# Altium footprint library LukaLIBRARY.PcbLib: 784 footprints (part 33 of 49)
Each footprint in its own frame and in the unit in brackets; x right, y up, seen from the top. Pads: shape width x height; smd on the part's side, far side on the other; paste and mask are expansions set on the pad; w line width, h text height; cw(c..) or ccw(c..) is an arc to the next point about the centre after c.
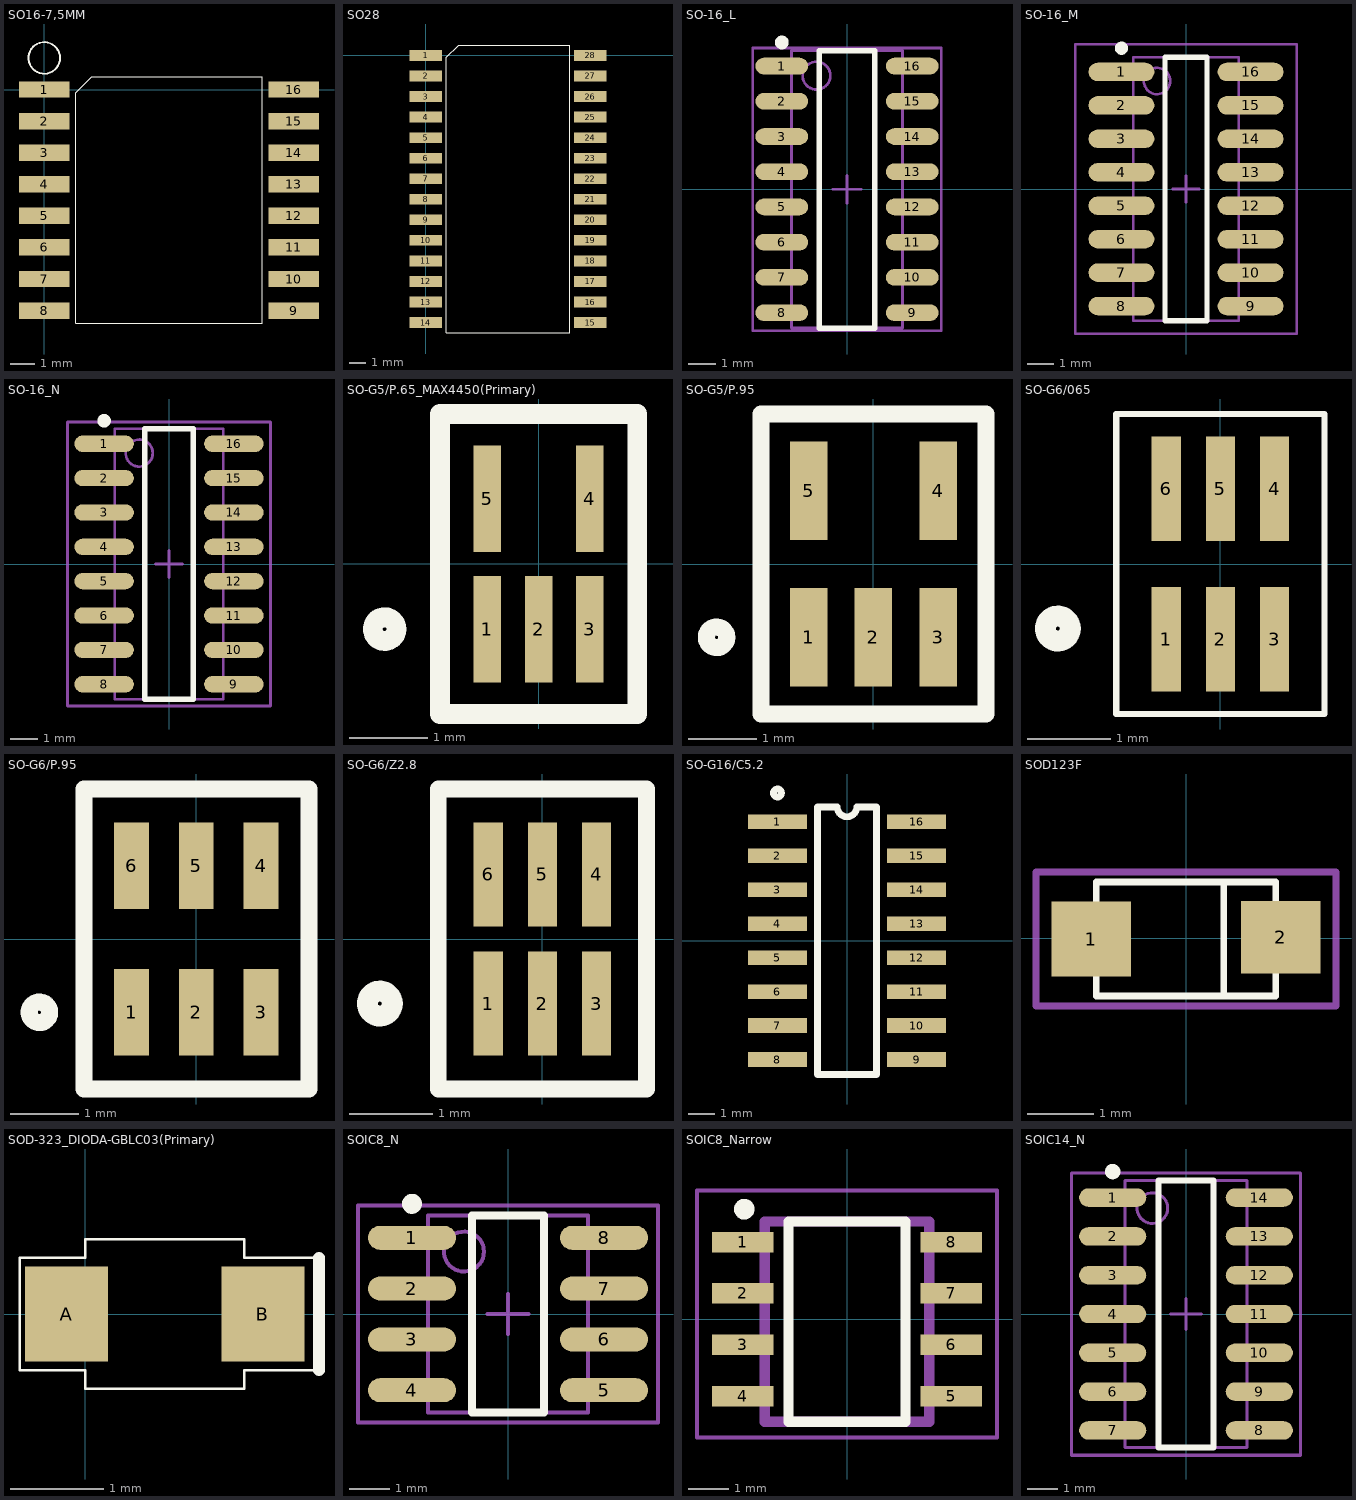
[diagram p32: the footprints below, top view; thin cyan lines are the x and y axes]

## SO16-7,5MM [mil]
pads (16):
  rect 80x26 smd mask-1000: 1(0,0) 2(0,-50) 3(0,-100) 4(0,-150) 5(0,-200) 6(0,-250) 7(0,-300) 8(0,-350) 9(395,-350) 10(395,-300) 11(395,-250) 12(395,-200) 13(395,-150) 14(395,-100) 15(395,-50) 16(395,0)
Top Overlay:
  circle w3: c0,50 r25
  lines w1: 50,-370 50,-5 75,20 345,20 345,-370 50,-370
Top Solder:
  region: -40,-263 40,-263 40,-237 -40,-237
  region: -40,-313 40,-313 40,-287 -40,-287
  region: -40,-363 40,-363 40,-337 -40,-337
  region: -40,-163 40,-163 40,-137 -40,-137
  region: -40,-213 40,-213 40,-187 -40,-187
  region: -40,-13 40,-13 40,13 -40,13
  region: -40,-63 40,-63 40,-37 -40,-37
  region: -40,-113 40,-113 40,-87 -40,-87
  region: 355,-363 435,-363 435,-337 355,-337
  region: 355,-313 435,-313 435,-287 355,-287
  region: 355,-263 435,-263 435,-237 355,-237
  region: 355,-163 435,-163 435,-137 355,-137
  region: 355,-213 435,-213 435,-187 355,-187
  region: 355,-63 435,-63 435,-37 355,-37
  region: 355,-13 435,-13 435,13 355,13
  region: 355,-113 435,-113 435,-87 355,-87

## SO28 [mil]
pads (28):
  rect 80x26 smd mask-1000: 1(0,0) 2(0,-50) 3(0,-100) 4(0,-150) 5(0,-200) 6(0,-250) 7(0,-300) 8(0,-350) 9(0,-400) 10(0,-450) 11(0,-500) 12(0,-550) 13(0,-600) 14(0,-650) 15(400,-650) 16(400,-600) 17(400,-550) 18(400,-500) 19(400,-450) 20(400,-400) 21(400,-350) 22(400,-300) 23(400,-250) 24(400,-200) 25(400,-150) 26(400,-100) 27(400,-50) 28(400,0)
Top Overlay:
  lines w1: 50,-675 50,-5 80,25 350,25 350,-675 50,-675
Top Solder:
  region: -40,-663 40,-663 40,-637 -40,-637
  region: -40,-363 40,-363 40,-337 -40,-337
  region: -40,-413 40,-413 40,-387 -40,-387
  region: -40,-463 40,-463 40,-437 -40,-437
  region: -40,-513 40,-513 40,-487 -40,-487
  region: -40,-563 40,-563 40,-537 -40,-537
  region: -40,-63 40,-63 40,-37 -40,-37
  region: -40,-113 40,-113 40,-87 -40,-87
  region: -40,-163 40,-163 40,-137 -40,-137
  region: -40,-213 40,-213 40,-187 -40,-187
  region: -40,-263 40,-263 40,-237 -40,-237
  region: 360,-663 440,-663 440,-637 360,-637
  region: 360,-563 440,-563 440,-537 360,-537
  region: 360,-513 440,-513 440,-487 360,-487
  region: 360,-463 440,-463 440,-437 360,-437
  region: 360,-413 440,-413 440,-387 360,-387
  region: 360,-363 440,-363 440,-337 360,-337
  region: 360,-263 440,-263 440,-237 360,-237
  region: 360,-213 440,-213 440,-187 360,-187
  region: 360,-163 440,-163 440,-137 360,-137
  region: 360,-113 440,-113 440,-87 360,-87
  region: 360,-63 440,-63 440,-37 360,-37
  region: -40,-313 40,-313 40,-287 -40,-287
  region: -40,-613 40,-613 40,-587 -40,-587
  region: -40,-13 40,-13 40,13 -40,13
  region: 360,-613 440,-613 440,-587 360,-587
  region: 360,-313 440,-313 440,-287 360,-287
  region: 360,-13 440,-13 440,13 360,13

## SO-16_L [mm] "SOIC, 16-Leads, Body 9.9x3.9mm, Pitch 1.27mm, IPC High Density"
height 1.75
pads (16):
  oval 1.9x0.6 smd: 1(-2.35,4.445) 2(-2.35,3.175) 3(-2.35,1.905) 4(-2.35,0.635) 5(-2.35,-0.635) 6(-2.35,-1.905) 7(-2.35,-3.175) 8(-2.35,-4.445) 9(2.35,-4.445) 10(2.35,-3.175) 11(2.35,-1.905) 12(2.35,-0.635) 13(2.35,0.635) 14(2.35,1.905) 15(2.35,3.175) 16(2.35,4.445)
Top Overlay:
  circle w0.25: c-2.35,5.295 r0.125
  lines w0.2: -1,-5 1,-5 1,5 -1,5 -1,-5
Mechanical 13:
  circle w0.1: c-1.1,4.1 r0.5
  lines w0.1: -2,-5 2,-5 2,5 -2,5 -2,-5
Mechanical 15:
  lines w0.1: -0.5,0 0.5,0 ; 0,-0.5 0,0.5 ; -3.4,-5.1 3.4,-5.1 3.4,5.1 -3.4,5.1 -3.4,-5.1
3D body: height 1.75, standoff 0, extent -2,-5 2,5

## SO-16_M [mm] "SOIC, 16-Leads, Body 9.9x3.9mm, Pitch 1.27mm, IPC Low Density"
height 1.75
pads (16):
  oval 2.5x0.7 smd: 1(-2.45,4.445) 2(-2.45,3.175) 3(-2.45,1.905) 4(-2.45,0.635) 5(-2.45,-0.635) 6(-2.45,-1.905) 7(-2.45,-3.175) 8(-2.45,-4.445) 9(2.45,-4.445) 10(2.45,-3.175) 11(2.45,-1.905) 12(2.45,-0.635) 13(2.45,0.635) 14(2.45,1.905) 15(2.45,3.175) 16(2.45,4.445)
Top Overlay:
  circle w0.25: c-2.45,5.345 r0.125
  lines w0.2: -0.8,-5 -0.8,5 0.8,5 0.8,-5 -0.8,-5
Mechanical 13:
  circle w0.1: c-1.1,4.1 r0.5
  lines w0.1: -2,-5 -2,5 2,5 2,-5 -2,-5
Mechanical 15:
  lines w0.1: -0.5,0 0.5,0 ; 0,-0.5 0,0.5 ; -4.2,-5.5 -4.2,5.5 4.2,5.5 4.2,-5.5 -4.2,-5.5
3D body: height 1.75, standoff 0, extent -2,-5 2,5

## SO-16_N [mm] "SOIC, 16-Leads, Body 9.9x3.9mm, Pitch 1.27mm, IPC Medium Density"
height 1.75
pads (16):
  oval 2.2x0.6 smd: 1(-2.4,4.445) 2(-2.4,3.175) 3(-2.4,1.905) 4(-2.4,0.635) 5(-2.4,-0.635) 6(-2.4,-1.905) 7(-2.4,-3.175) 8(-2.4,-4.445) 9(2.4,-4.445) 10(2.4,-3.175) 11(2.4,-1.905) 12(2.4,-0.635) 13(2.4,0.635) 14(2.4,1.905) 15(2.4,3.175) 16(2.4,4.445)
Top Overlay:
  circle w0.25: c-2.4,5.295 r0.125
  lines w0.2: -0.9,-5 0.9,-5 0.9,5 -0.9,5 -0.9,-5
Mechanical 13:
  circle w0.1: c-1.1,4.1 r0.5
  lines w0.1: -2,-5 2,-5 2,5 -2,5 -2,-5
Mechanical 15:
  lines w0.1: -0.5,0 0.5,0 ; 0,-0.5 0,0.5 ; -3.75,-5.25 3.75,-5.25 3.75,5.25 -3.75,5.25 -3.75,-5.25
3D body: height 1.75, standoff 0, extent -2,-5 2,5

## SO-G5/P.65_MAX4450(Primary) [mm]
pads (5):
  rect 0.35x1.35 smd: 1(-0.65,-0.825) 2(0,-0.825) 3(0.65,-0.825) 4(0.65,0.825) 5(-0.65,0.825)
Top Overlay:
  circle w0.25: c-1.95,-0.825 r0.15
  lines w0.25: -1.25,-1.9 1.25,-1.9 1.25,1.9 -1.25,1.9 -1.25,-1.9

## SO-G5/P.95 [mm]
pads (5):
  rect 0.55x1.45 smd: 1(-0.95,-1.075) 2(0,-1.075) 3(0.95,-1.075) 4(0.95,1.075) 5(-0.95,1.075)
Top Overlay:
  circle w0.25: c-2.3,-1.075 r0.15
  lines w0.25: -1.65,-2.2 1.65,-2.2 1.65,2.2 -1.65,2.2 -1.65,-2.2

## SO-G6/065 [mm]
pads (6):
  rect 0.35x1.25 smd: 1(-0.65,-0.902) 2(0,-0.902) 3(0.65,-0.902) 4(0.65,0.902) 5(0,0.902) 6(-0.65,0.902)
Top Overlay:
  circle w0.25: c-1.95,-0.775 r0.15
  lines w0.076: -1.25,-1.8 1.25,-1.8 1.25,1.8 -1.25,1.8 -1.25,-1.8

## SO-G6/P.95 [mm]
pads (6):
  rect 0.508x1.27 smd: 1(-0.95,-1.075) 2(0,-1.075) 3(0.95,-1.075) 4(0.95,1.075) 5(0,1.075) 6(-0.95,1.075)
Top Overlay:
  circle w0.25: c-2.3,-1.075 r0.15
  lines w0.25: -1.65,-2.2 1.65,-2.2 1.65,2.2 -1.65,2.2 -1.65,-2.2

## SO-G6/Z2.8 [mm]
pads (6):
  rect 0.35x1.25 smd: 1(-0.65,-0.775) 2(0,-0.775) 3(0.65,-0.775) 4(0.65,0.775) 5(0,0.775) 6(-0.65,0.775)
Top Overlay:
  circle w0.25: c-1.95,-0.775 r0.15
  lines w0.2: -1.25,-1.8 1.25,-1.8 1.25,1.8 -1.25,1.8 -1.25,-1.8

## SO-G16/C5.2 [mm]
pads (16):
  rect 2.2x0.55 smd: 1(-2.6,4.445) 2(-2.6,3.175) 3(-2.6,1.905) 4(-2.6,0.635) 5(-2.6,-0.635) 6(-2.6,-1.905) 7(-2.6,-3.175) 8(-2.6,-4.445) 9(2.6,-4.445) 10(2.6,-3.175) 11(2.6,-1.905) 12(2.6,-0.635) 13(2.6,0.635) 14(2.6,1.905) 15(2.6,3.175) 16(2.6,4.445)
Top Overlay:
  circle w0.25: c-2.6,5.52 r0.15
  lines w0.25: -1.1,-5 1.1,-5 1.1,5 0.367,5 cw(c0,5) -0.367,5 -1.1,5 -1.1,-5

## SOD123F [mm] "3.6mm x 1.7mm"
pads (2):
  rect 1.2x1.14 smd: 1(-1.435,-0.013)
  rect 1.2x1.1 smd: 2(1.435,0.013)
Top Overlay:
  lines w0.1: 0.572,-0.876 0.572,0.851 ; -1.359,-0.876 -1.359,0.851 1.359,0.851 1.359,-0.876 -1.359,-0.876
Mechanical 15:
  lines w0.1: -2.273,-1.029 2.273,-1.029 2.273,1.003 -2.273,1.003 -2.273,-1.029

## SOD-323_DIODA-GBLC03(Primary) [mil]
pads (2):
  rect 35x40 smd mask-1000: A(-7.87,0) B(74.8,0)
Top Overlay:
  lines w0.98: -27.56,-23.62 0,-23.62 0,-31.5 59.06,-31.5 66.93,-31.5 66.93,-23.62 98.43,-23.62 ; -27.56,23.62 0,23.62 0,31.5 66.93,31.5 66.93,23.62 98.43,23.62
  lines w1: -27.56,-23.62 -27.56,23.62
  lines w4.92: 98.43,-23.62 98.43,23.62
Top Solder:
  region: -25.37,-20 9.63,-20 9.63,20 -25.37,20
  region: 57.3,-20 92.3,-20 92.3,20 57.3,20

## SOIC8_N [mm] "SOIC, 8-Leads, Body 4.8x3.8mm, Pitch 1.27mm, IPC Medium Density"
height 1.91
pads (8):
  oval 2.2x0.6 smd: 1(-2.4,1.905) 2(-2.4,0.635) 3(-2.4,-0.635) 4(-2.4,-1.905) 5(2.4,-1.905) 6(2.4,-0.635) 7(2.4,0.635) 8(2.4,1.905)
Top Overlay:
  circle w0.25: c-2.4,2.755 r0.125
  lines w0.2: -0.9,-2.464 -0.9,2.46 0.9,2.46 0.9,-2.464 -0.9,-2.464
Mechanical 13:
  circle w0.1: c-1.1,1.56 r0.5
  lines w0.1: -2,-2.464 -2,2.46 2,2.46 2,-2.464 -2,-2.464
Mechanical 15:
  lines w0.1: -0.508,0 0.508,0 ; 0,-0.5 0,0.5 ; -3.75,-2.718 -3.75,2.71 3.75,2.71 3.75,-2.718 -3.75,-2.718
3D body: height 1.91, standoff 0, extent -2.007,-2.464 2.007,2.46

## SOIC8_Narrow [mil]
pads (8):
  rect 60x20 smd: 1(-101.5,75) 2(-101.5,25) 3(-101.5,-25) 4(-101.5,-75) 5(101.5,-75) 6(101.5,-25) 7(101.5,25) 8(101.5,75)
Top Overlay:
  circle w10: c-100,107 r5
  lines w10: -57,-100 -57,95 57,95 57,-100 -57,-100
Mechanical 13:
  lines w10: -80,-100 -80,95 80,95 80,-100 -80,-100
Mechanical 15:
  lines w3.94: -146,-115 -146,125 146,125 146,-115 -146,-115

## SOIC14_N [mm] "SOIC, 14-Leads, Body 8.5x3.9mm, Pitch 1.27mm, IPC Medium Density"
height 1.91
pads (14):
  oval 2.2x0.6 smd: 1(-2.4,3.81) 2(-2.4,2.54) 3(-2.4,1.27) 4(-2.4,0) 5(-2.4,-1.27) 6(-2.4,-2.54) 7(-2.4,-3.81) 8(2.4,-3.81) 9(2.4,-2.54) 10(2.4,-1.27) 11(2.4,0) 12(2.4,1.27) 13(2.4,2.54) 14(2.4,3.81)
Top Overlay:
  circle w0.25: c-2.4,4.66 r0.125
  lines w0.2: -0.9,-4.369 0.9,-4.369 0.9,4.365 -0.9,4.365 -0.9,-4.369
Mechanical 13:
  circle w0.1: c-1.1,3.465 r0.5
  lines w0.1: -2,-4.369 2,-4.369 2,4.365 -2,4.365 -2,-4.369
Mechanical 15:
  lines w0.1: -0.508,0 0.508,0 ; 0,-0.5 0,0.5 ; -3.75,-4.623 3.75,-4.623 3.75,4.615 -3.75,4.615 -3.75,-4.623
3D body: height 1.91, standoff 0, extent -2,-4.369 2,4.365